# Altium footprint library Miscellaneous C_nn.PcbLib: 416 footprints (part 4 of 26)
Each footprint in its own frame and in the unit in brackets; x right, y up, seen from the top. Pads: shape width x height; smd on the part's side, far side on the other; paste and mask are expansions set on the pad; w line width, h text height; cw(c..) or ccw(c..) is an arc to the next point about the centre after c.
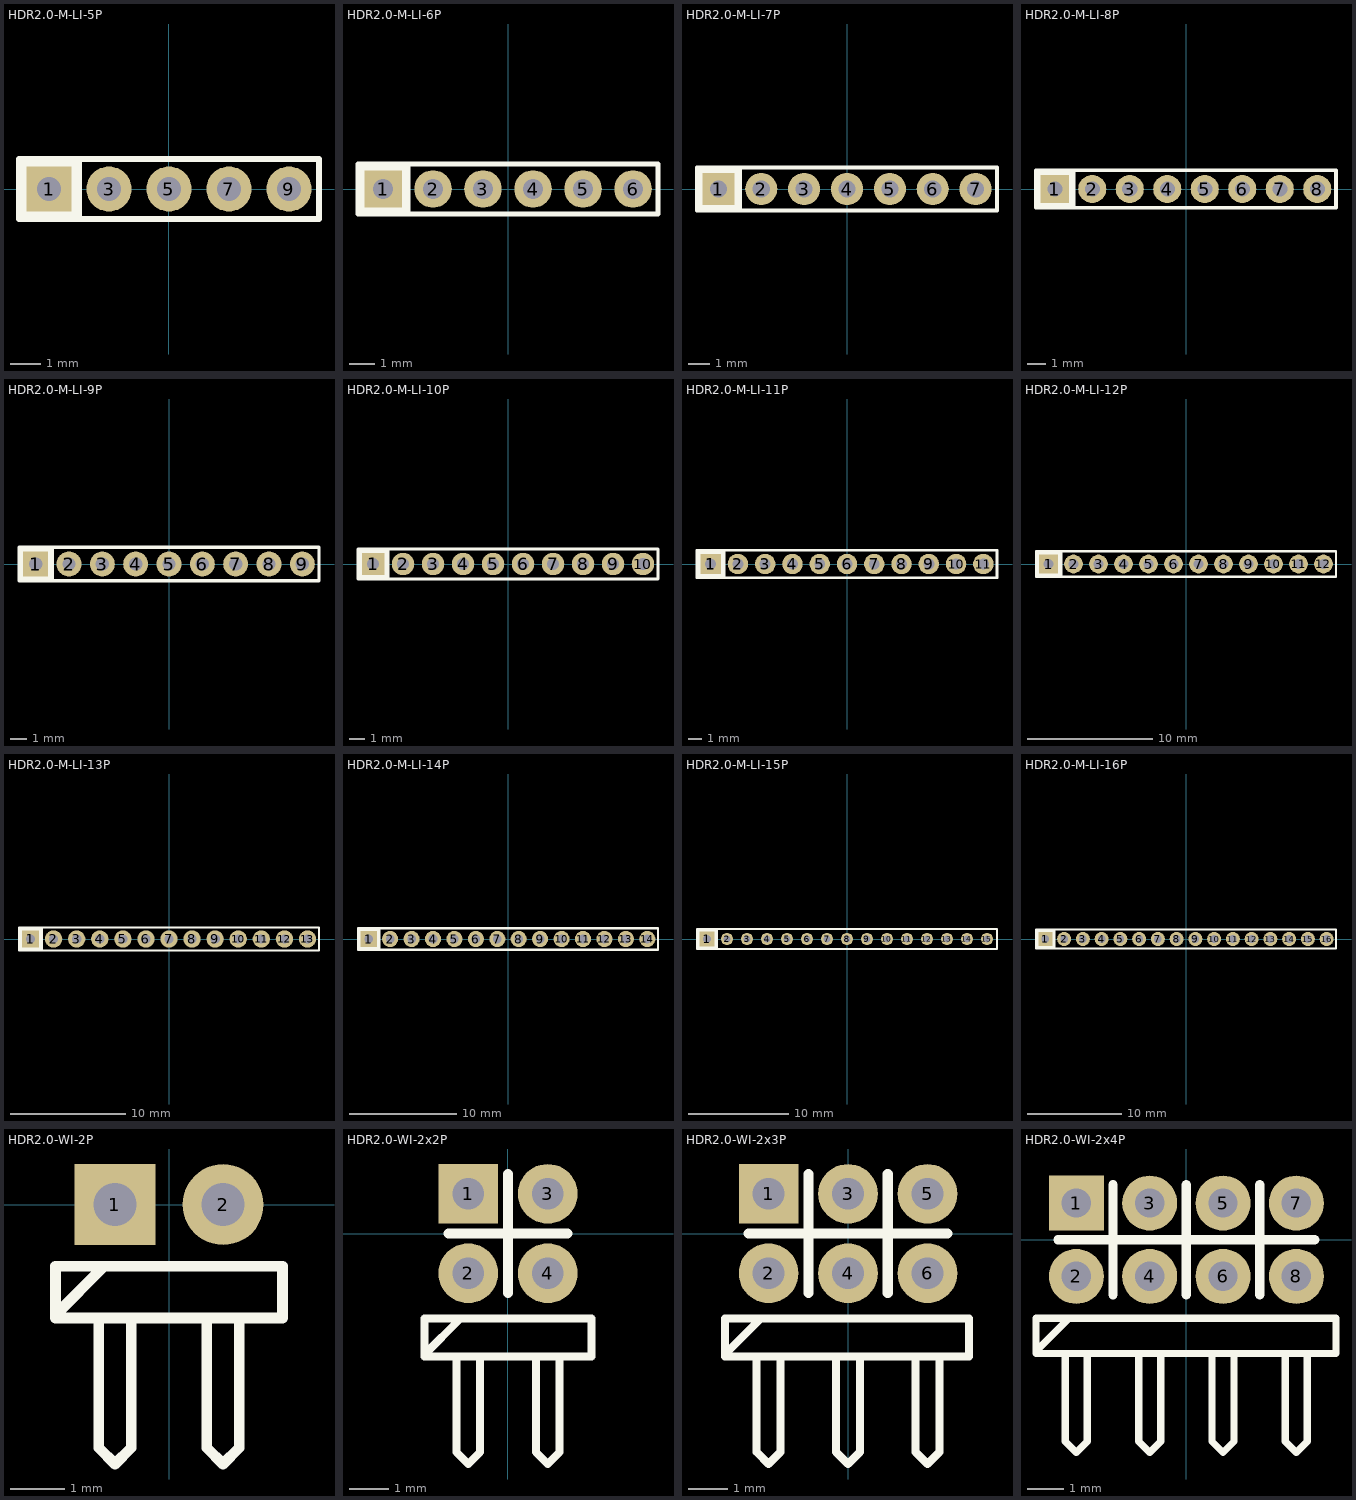
[diagram p3: the footprints below, top view; thin cyan lines are the x and y axes]

## HDR2.0-M-LI-5P [mm] "直插排母，脚距：2.0mm"
pads (5):
  rect 1.5x1.5 hole 0.8: 1(-4,0)
  round 1.5 hole 0.8: 3(-2,0) 5(0,0) 7(2,0) 9(4,0)
Top Overlay:
  rectangle: -5,-1 -3,1
  lines w0.2: -3,-1 -3,1 ; -5,-1 5,-1 ; -5,-1 -5,1 5,1 5,-1 ; -5,-1 5,-1
3D body "HDR2.0-M-LI-5P.STEP": height 5.5, standoff -2.27, extent -5,-1 5,1

## HDR2.0-M-LI-6P [mm] "直插排母，脚距：2.0mm"
pads (6):
  rect 1.5x1.5 hole 0.8: 1(-5,0)
  round 1.5 hole 0.8: 2(-3,0) 3(-1,0) 4(1,0) 5(3,0) 6(5,0)
Top Overlay:
  rectangle: -6,-1 -4,1
  lines w0.2: -4,-1 -4,1 ; -6,-1 -6,1 6,1 6,-1 -6,-1
3D body "HDR2.0-M-LI-6P.STEP": height 5.5, standoff -2.27, extent -6,-1 6,1

## HDR2.0-M-LI-7P [mm] "直插排母，脚距：2.0mm"
pads (7):
  rect 1.5x1.5 hole 0.8: 1(-6,0)
  round 1.5 hole 0.8: 2(-4,0) 3(-2,0) 4(0,0) 5(2,0) 6(4,0) 7(6,0)
Top Overlay:
  rectangle: -7,-1 -5,1
  lines w0.2: -5,-1 -5,1 ; -7,-1 7,-1 7,1 -7,1 -7,-1
3D body "HDR2.0-M-LI-7P.STEP": height 5.5, standoff -2.27, extent -7,-1 7,1

## HDR2.0-M-LI-8P [mm] "直插排母，脚距：2.0mm"
pads (8):
  rect 1.5x1.5 hole 0.8: 1(-7,0)
  round 1.5 hole 0.8: 2(-5,0) 3(-3,0) 4(-1,0) 5(1,0) 6(3,0) 7(5,0) 8(7,0)
Top Overlay:
  rectangle: -8,-1 -6,1
  lines w0.2: -6,-1 -6,1 ; -8,-1 8,-1 8,1 -8,1 -8,-1
3D body "HDR2.0-M-LI-8P.STEP": height 5.5, standoff -2.27, extent -8,-1 8,1

## HDR2.0-M-LI-9P [mm] "直插排母，脚距：2.0mm"
pads (9):
  rect 1.5x1.5 hole 0.8: 1(-8,0)
  round 1.5 hole 0.8: 2(-6,0) 3(-4,0) 4(-2,0) 5(0,0) 6(2,0) 7(4,0) 8(6,0) 9(8,0)
Top Overlay:
  rectangle: -9,-1 -7,1
  lines w0.2: -7,-1 -7,1 ; -9,-1 9,-1 9,1 -9,1 -9,-1
3D body "HDR2.0-M-LI-9P.STEP": height 5.5, standoff -2.27, extent -9,-1 9,1

## HDR2.0-M-LI-10P [mm] "直插排母，脚距：2.0mm"
pads (10):
  rect 1.5x1.5 hole 0.8: 1(-9,0)
  round 1.5 hole 0.8: 2(-7,0) 3(-5,0) 4(-3,0) 5(-1,0) 6(1,0) 7(3,0) 8(5,0) 9(7,0) 10(9,0)
Top Overlay:
  rectangle: -10,-1 -8,1
  lines w0.2: -8,-1 -8,1 ; -10,-1 -10,1 10,1 10,-1 -10,-1
3D body "HDR2.0-M-LI-10P.STEP": height 5.5, standoff -2.27, extent -10,-1 10,1

## HDR2.0-M-LI-11P [mm] "直插排母，脚距：2.0mm"
pads (11):
  rect 1.5x1.5 hole 0.8: 1(-10,0)
  round 1.5 hole 0.8: 2(-8,0) 3(-6,0) 4(-4,0) 5(-2,0) 6(0,0) 7(2,0) 8(4,0) 9(6,0) 10(8,0) 11(10,0)
Top Overlay:
  rectangle: -11,-1 -9,1
  lines w0.2: -9,-1 -9,1 ; -11,-1 -11,1 11,1 11,-1 -11,-1
3D body "HDR2.0-M-LI-11P.STEP": height 5.5, standoff -2.27, extent -11,-1 11,1

## HDR2.0-M-LI-12P [mm] "直插排母，脚距：2.0mm"
pads (12):
  rect 1.5x1.5 hole 0.8: 1(-11,0)
  round 1.5 hole 0.8: 2(-9,0) 3(-7,0) 4(-5,0) 5(-3,0) 6(-1,0) 7(1,0) 8(3,0) 9(5,0) 10(7,0) 11(9,0) 12(11,0)
Top Overlay:
  rectangle: -12,-1 -10,1
  lines w0.2: -10,-1 -10,1 ; -12,-1 12,-1 12,1 -12,1 -12,-1
3D body "HDR2.0-M-LI-12P.STEP": height 5.5, standoff -2.27, extent -12,-1 12,1

## HDR2.0-M-LI-13P [mm] "直插排母，脚距：2.0mm"
pads (13):
  rect 1.5x1.5 hole 0.8: 1(-12,0)
  round 1.5 hole 0.8: 2(-10,0) 3(-8,0) 4(-6,0) 5(-4,0) 6(-2,0) 7(0,0) 8(2,0) 9(4,0) 10(6,0) 11(8,0) 12(10,0) 13(12,0)
Top Overlay:
  rectangle: -13,-1 -11,1
  lines w0.2: -11,-1 -11,1 ; -13,-1 -13,1 13,1 13,-1 -13,-1
3D body "HDR2.0-M-LI-13P.STEP": height 5.5, standoff -2.27, extent -13,-1 13,1

## HDR2.0-M-LI-14P [mm] "直插排母，脚距：2.0mm"
pads (14):
  rect 1.5x1.5 hole 0.8: 1(-13,0)
  round 1.5 hole 0.8: 2(-11,0) 3(-9,0) 4(-7,0) 5(-5,0) 6(-3,0) 7(-1,0) 8(1,0) 9(3,0) 10(5,0) 11(7,0) 12(9,0) 13(11,0) 14(13,0)
Top Overlay:
  rectangle: -14,-1 -12,1
  lines w0.2: -12,-1 -12,1 ; -14,-1 14,-1 14,1 -14,1 -14,-1
3D body "HDR2.0-M-LI-14P.STEP": height 5.5, standoff -2.27, extent -14,-1 14,1

## HDR2.0-M-LI-15P [mm] "直插排母，脚距：2.0mm"
pads (15):
  rect 1.5x1.5 hole 0.8: 1(-14,0)
  round 1.2 hole 0.7: 2(-12,0) 3(-10,0) 4(-8,0) 5(-6,0) 6(-4,0) 7(-2,0) 8(0,0) 9(2,0) 10(4,0) 11(6,0) 12(8,0) 13(10,0) 14(12,0) 15(14,0)
Top Overlay:
  rectangle: -15,-1 -13,1
  lines w0.2: -13,-1 -13,1 ; -15,-1 -15,1 15,1 15,-1 -15,-1
3D body "HDR2.0-M-LI-15P.STEP": height 5.5, standoff -2.27, extent -15,-1 15,1

## HDR2.0-M-LI-16P [mm] "直插排母，脚距：2.0mm"
pads (16):
  rect 1.5x1.5 hole 0.8: 1(-15,0)
  round 1.5 hole 0.8: 2(-13,0) 3(-11,0) 4(-9,0) 5(-7,0) 6(-5,0) 7(-3,0) 8(-1,0) 9(1,0) 10(3,0) 11(5,0) 12(7,0) 13(9,0) 14(11,0) 15(13,0) 16(15,0)
Top Overlay:
  rectangle: -16,-1 -14,1
  lines w0.2: -14,-1 -14,1 ; -16,-1 16,-1 16,1 -16,1 -16,-1
3D body "HDR2.0-M-LI-16P.STEP": height 5.5, standoff -2.27, extent -16,-1 16,1

## HDR2.0-WI-2P [mm] "卧插，脚距：2.0mm"
pads (2):
  rect 1.5x1.5 hole 0.8: 1(-1,0)
  round 1.5 hole 0.8: 2(1,0)
Top Overlay:
  lines w0.2: -2.1,-1.8 -2.1,-1.743 ; -1.3,-2.2 -1.3,-4.5 -1,-4.8 -0.7,-4.5 -0.7,-2.1 ; -1.2,-1.143 -2.1,-2.043 -2.1,-2.1 ; 0.7,-2.2 0.7,-4.5 1,-4.8 1.3,-4.5 1.3,-2.1 ; -2.1,-2.1 2.1,-2.1 2.1,-1.143 -0.492,-1.143 -2.1,-1.143 -2.1,-2.1
3D body "HDR2.0-WI-2P.STEP": height 3.25, standoff -2.8, extent -2,-5 2,1

## HDR2.0-WI-2x2P [mm] "卧插，脚距：2.0mm"
pads (4):
  rect 1.5x1.5 hole 0.8: 1(-1,1)
  round 1.5 hole 0.8: 2(-1,-1) 3(1,1) 4(1,-1)
Top Overlay:
  lines w0.2: -2.1,-2.8 -2.1,-2.743 ; -1.3,-3.2 -1.3,-5.5 -1,-5.8 -0.7,-5.5 -0.7,-3.1 ; -1.2,-2.143 -2.1,-3.043 -2.1,-3.1 ; 0.7,-3.2 0.7,-5.5 1,-5.8 1.3,-5.5 1.3,-3.1 ; -2.1,-3.1 2.1,-3.1 2.1,-2.143 -0.492,-2.143 -2.1,-2.143 -2.1,-3.1
  lines w0.254: -1.5,0 1.5,0 ; 0,-1.5 0,1.5
Bottom Overlay:
  lines w0.254: -1.5,0 1.5,0 ; 0,-1.5 0,1.5
3D body "HDR2.0-WI-2x2P.STEP": height 5.25, standoff -2.77, extent -2,-6 2,2

## HDR2.0-WI-2x3P [mm] "卧插，脚距：2.0mm"
pads (6):
  rect 1.5x1.5 hole 0.8: 1(-2,1)
  round 1.5 hole 0.8: 2(-2,-1) 3(0,1) 4(0,-1) 5(2,1) 6(2,-1)
Top Overlay:
  lines w0.2: -3.1,-2.8 -3.1,-2.743 ; -2.3,-3.2 -2.3,-5.5 -2,-5.8 -1.7,-5.5 -1.7,-3.1 ; -2.2,-2.143 -3.1,-3.043 -3.1,-3.1 ; -0.3,-3.2 -0.3,-5.5 0,-5.8 0.3,-5.5 0.3,-3.1 ; 1.7,-3.2 1.7,-5.5 2,-5.8 2.3,-5.5 2.3,-3.1 ; -3.1,-3.1 -3.1,-2.143 -1.492,-2.143 3.048,-2.143 3.048,-3.1 -3.1,-3.1
  lines w0.254: -2.5,0 2.5,0 ; -1,-1.5 -1,1.5 ; 1,-1.5 1,1.5
Bottom Overlay:
  lines w0.254: -2.5,0 2.5,0 ; -1,-1.5 -1,1.5 ; 1,-1.5 1,1.5
3D body "HDR2.0-WI-2x3P.STEP": height 5.25, standoff -2.77, extent -3,-6 3,2

## HDR2.0-WI-2x4P [mm] "卧插，脚距：2.0mm"
pads (8):
  rect 1.5x1.5 hole 0.8: 1(-3,1)
  round 1.5 hole 0.8: 2(-3,-1) 3(-1,1) 4(-1,-1) 5(1,1) 6(1,-1) 7(3,1) 8(3,-1)
Top Overlay:
  lines w0.2: -4.1,-2.8 -4.1,-2.743 ; -3.3,-3.2 -3.3,-5.5 -3,-5.8 -2.7,-5.5 -2.7,-3.1 ; -3.2,-2.143 -4.1,-3.043 -4.1,-3.1 ; -1.3,-3.2 -1.3,-5.5 -1,-5.8 -0.7,-5.5 -0.7,-3.1 ; 0.7,-3.2 0.7,-5.5 1,-5.8 1.3,-5.5 1.3,-3.1 ; 2.7,-3.2 2.7,-5.5 3,-5.8 3.3,-5.5 3.3,-3.1 ; -4.1,-3.1 4.08,-3.1 4.08,-2.143 -2.492,-2.143 -4.1,-2.143 -4.1,-3.1
  lines w0.254: -3.5,0 3.5,0 ; -2,-1.5 -2,1.5 ; 0,-1.5 0,1.5 ; 2,-1.5 2,1.5
Bottom Overlay:
  lines w0.254: -3.5,0 3.5,0 ; -2,-1.5 -2,1.5 ; 0,-1.5 0,1.5 ; 2,-1.5 2,1.5
3D body "HDR2.0-WI-2x4P.STEP": height 5.25, standoff -2.77, extent -4,-6 4,2